# Altium footprint library PcbLib1.PcbLib: 1016 footprints (part 63 of 64)
Each footprint in its own frame and in the unit in brackets; x right, y up, seen from the top. Pads: shape width x height; smd on the part's side, far side on the other; paste and mask are expansions set on the pad; w line width, h text height; cw(c..) or ccw(c..) is an arc to the next point about the centre after c.
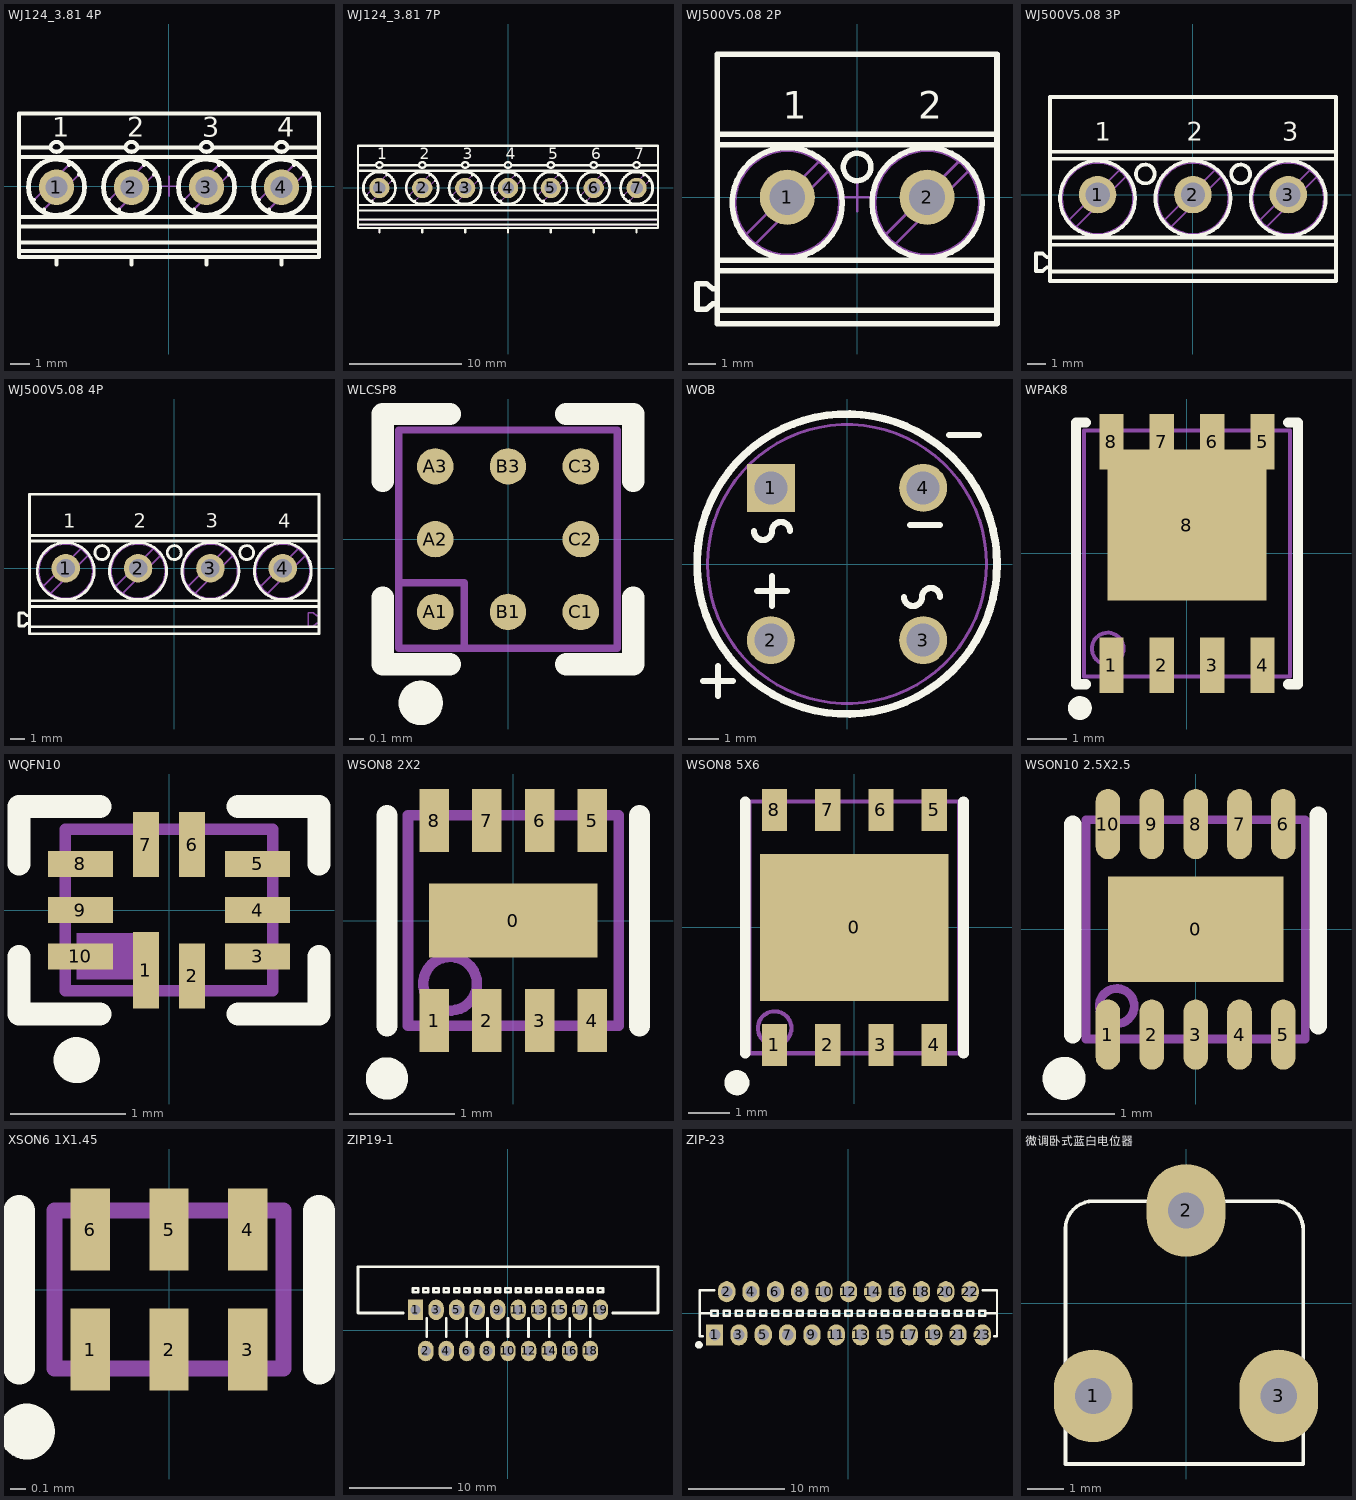
[diagram p62: the footprints below, top view; thin cyan lines are the x and y axes]

## WJ124_3.81 4P [mm] "PCB Terminal Block, Pitch 3.81mm, 4 Positions, Screw Connection"
height 8.5
pads (4):
  round 1.8 hole 1.1: 1(-5.715,-0.05) 2(-1.905,-0.05) 3(1.905,-0.05) 4(5.715,-0.05)
Top Overlay:
  circle w0.2: c1.905,-0.05 r1.45
  circle w0.2: c5.715,-0.05 r1.45
  circle w0.2: c-1.905,-0.05 r1.45
  circle w0.2: c-5.715,-0.05 r1.45
  circle w0.2: c5.715,-0.05 r1.4
  circle w0.2: c1.905,-0.05 r1.4
  circle w0.2: c-1.905,-0.05 r1.4
  circle w0.2: c-5.715,-0.05 r1.4
  lines w0.2: -7.62,-3.3 7.62,-3.3 ; -7.62,-2.861 7.62,-2.861 ; -7.62,-2.049 7.62,-2.049 ; -7.62,-1.566 7.62,-1.566 ; -7.62,1.487 7.62,1.487 ; -7.62,1.962 -6.017,1.962 ; -6.921,-0.761 -6.848,-0.688 ; -6.426,-1.256 -6.353,-1.183 ; -5.715,-3.981 -5.715,-3.6 ; -5.413,1.962 -2.207,1.962 ; -5.077,1.083 -5.004,1.156 ; -4.582,0.588 -4.509,0.661 ; -3.111,-0.761 -3.038,-0.688 ; -2.616,-1.256 -2.543,-1.183 ; -1.905,-3.981 -1.905,-3.6 ; -1.603,1.962 1.603,1.962 ; -1.267,1.083 -1.194,1.156 ; -0.772,0.588 -0.699,0.661 ; 0.699,-0.761 0.772,-0.688 ; 1.194,-1.256 1.267,-1.183 ; 1.905,-3.981 1.905,-3.6 ; 2.207,1.962 5.413,1.962 ; 2.543,1.083 2.616,1.156 ; 3.038,0.588 3.111,0.661 ; 4.509,-0.761 4.582,-0.688 ; 5.004,-1.256 5.077,-1.183 ; 5.715,-3.981 5.715,-3.6 ; 6.017,1.962 7.62,1.962 ; 6.353,1.083 6.426,1.156 ; 6.848,0.588 6.921,0.661 ; -7.62,-3.6 7.62,-3.6 7.62,3.7 -7.62,3.7 -7.62,-3.6 ; -6.016,1.923 cw(c-5.715,1.948) -5.414,1.923 cw(c-5.715,2.098) -6.016,1.923 ; -2.206,1.923 cw(c-1.905,1.948) -1.604,1.923 cw(c-1.905,2.098) -2.206,1.923 ; 1.604,1.923 cw(c1.905,1.948) 2.206,1.923 cw(c1.905,2.098) 1.604,1.923 ; 5.414,1.923 cw(c5.715,1.948) 6.016,1.923 cw(c5.715,2.098) 5.414,1.923
  text "1" at -5.925,2.525 h1
  text "2" at -2.115,2.525 h1
  text "3" at 1.695,2.525 h1
  text "4" at 5.505,2.525 h1
Mechanical 8:
  lines w0.1: -6.215,-0.05 -5.715,-0.05 ; -5.715,-0.55 -5.715,-0.05 ; -5.715,0.45 -5.715,-0.05 ; -5.215,-0.05 -5.715,-0.05 ; -2.405,-0.05 -1.905,-0.05 ; -1.905,-0.55 -1.905,-0.05 ; -1.905,0.45 -1.905,-0.05 ; -1.405,-0.05 -1.905,-0.05 ; -0.5,0 0,0 ; 0,-0.5 0,0 ; 0,0.5 0,0 ; 0.5,0 0,0 ; 1.405,-0.05 1.905,-0.05 ; 1.905,-0.55 1.905,-0.05 ; 1.905,0.45 1.905,-0.05 ; 2.405,-0.05 1.905,-0.05 ; 5.215,-0.05 5.715,-0.05 ; 5.715,-0.55 5.715,-0.05 ; 5.715,0.45 5.715,-0.05 ; 6.215,-0.05 5.715,-0.05
Mechanical 14:
  circle w0.1: c1.905,-0.05 r1.45
  circle w0.1: c5.715,-0.05 r1.45
  circle w0.1: c-1.905,-0.05 r1.45
  circle w0.1: c-5.715,-0.05 r1.45
  circle w0.1: c5.715,-0.05 r1.4
  circle w0.1: c1.905,-0.05 r1.4
  circle w0.1: c-1.905,-0.05 r1.4
  circle w0.1: c-5.715,-0.05 r1.4
  lines w0.1: -7.62,-3.3 7.62,-3.3 ; -7.62,-2.861 7.62,-2.861 ; -7.62,-2.049 7.62,-2.049 ; -7.62,-1.566 7.62,-1.566 ; -7.62,1.487 7.62,1.487 ; -7.62,1.962 -6.017,1.962 ; -6.921,-0.761 -5.004,1.156 ; -6.426,-1.256 -4.509,0.661 ; -5.715,-3.981 -5.715,-3.6 ; -5.413,1.962 -2.207,1.962 ; -3.111,-0.761 -1.194,1.156 ; -2.616,-1.256 -0.699,0.661 ; -1.905,-3.981 -1.905,-3.6 ; -1.603,1.962 1.603,1.962 ; 0.699,-0.761 2.616,1.156 ; 1.194,-1.256 3.111,0.661 ; 1.905,-3.981 1.905,-3.6 ; 2.207,1.962 5.413,1.962 ; 4.509,-0.761 6.426,1.156 ; 5.004,-1.256 6.921,0.661 ; 5.715,-3.981 5.715,-3.6 ; 6.017,1.962 7.62,1.962 ; -7.62,-3.6 7.62,-3.6 7.62,3.7 -7.62,3.7 -7.62,-3.6 ; -6.016,1.923 cw(c-5.715,1.948) -5.414,1.923 cw(c-5.715,2.098) -6.016,1.923 ; -2.206,1.923 cw(c-1.905,1.948) -1.604,1.923 cw(c-1.905,2.098) -2.206,1.923 ; 1.604,1.923 cw(c1.905,1.948) 2.206,1.923 cw(c1.905,2.098) 1.604,1.923 ; 5.414,1.923 cw(c5.715,1.948) 6.016,1.923 cw(c5.715,2.098) 5.414,1.923
  text "1" at -5.925,2.525 h1
  text "2" at -2.115,2.525 h1
  text "3" at 1.695,2.525 h1
  text "4" at 5.505,2.525 h1
3D body "PHOENIX_1727036.stp": height 8.5, standoff -3.5, extent -7.62,-3.6 7.62,3.7

## WJ124_3.81 7P [mm] "PCB Terminal Block, Pitch 3.81mm, 7 Positions, Screw Connection"
height 8.5
pads (7):
  round 1.8 hole 1.1: 1(-11.43,0) 2(-7.62,0) 3(-3.81,0) 4(0,0) 5(3.81,0) 6(7.62,0) 7(11.43,0)
Top Overlay:
  circle w0.2: c-11.43,0 r1.45
  circle w0.2: c-11.43,0 r1.4
  circle w0.2: c-7.62,0 r1.45
  circle w0.2: c-7.62,0 r1.4
  circle w0.2: c-3.81,0 r1.45
  circle w0.2: c-3.81,0 r1.4
  circle w0.2: c0,0 r1.45
  circle w0.2: c0,0 r1.4
  circle w0.2: c3.81,0 r1.45
  circle w0.2: c3.81,0 r1.4
  circle w0.2: c7.62,0 r1.45
  circle w0.2: c7.62,0 r1.4
  circle w0.2: c11.43,0 r1.45
  circle w0.2: c11.43,0 r1.4
  lines w0.2: -13.335,-3.25 13.335,-3.25 ; -13.335,-2.811 13.335,-2.811 ; -13.335,-1.999 13.335,-1.999 ; -13.335,-1.516 13.335,-1.516 ; -13.335,1.537 13.335,1.537 ; -13.335,2.012 -11.732,2.012 ; -12.636,-0.711 -12.563,-0.638 ; -12.141,-1.206 -12.068,-1.133 ; -11.43,-3.931 -11.43,-3.55 ; -11.128,2.012 -7.922,2.012 ; -10.792,1.133 -10.719,1.206 ; -10.297,0.638 -10.224,0.711 ; -8.826,-0.711 -8.753,-0.638 ; -8.331,-1.206 -8.258,-1.133 ; -7.62,-3.931 -7.62,-3.55 ; -7.318,2.012 -4.112,2.012 ; -6.982,1.133 -6.909,1.206 ; -6.487,0.638 -6.414,0.711 ; -5.016,-0.711 -4.943,-0.638 ; -4.521,-1.206 -4.448,-1.133 ; -3.81,-3.931 -3.81,-3.55 ; -3.508,2.012 -0.302,2.012 ; -3.172,1.133 -3.099,1.206 ; -2.677,0.638 -2.604,0.711 ; -1.206,-0.711 -1.133,-0.638 ; -0.711,-1.206 -0.638,-1.133 ; 0,-3.931 0,-3.55 ; 0.302,2.012 3.508,2.012 ; 0.638,1.133 0.711,1.206 ; 1.133,0.638 1.206,0.711 ; 2.604,-0.711 2.677,-0.638 ; 3.099,-1.206 3.172,-1.133 ; 3.81,-3.931 3.81,-3.55 ; 4.112,2.012 7.318,2.012 ; 4.448,1.133 4.521,1.206 ; 4.943,0.638 5.016,0.711 ; 6.414,-0.711 6.487,-0.638 ; 6.909,-1.206 6.982,-1.133 ; 7.62,-3.931 7.62,-3.55 ; 7.922,2.012 11.128,2.012 ; 8.258,1.133 8.331,1.206 ; 8.753,0.638 8.826,0.711 ; 10.224,-0.711 10.297,-0.638 ; 10.719,-1.206 10.792,-1.133 ; 11.43,-3.931 11.43,-3.55 ; 11.732,2.012 13.335,2.012 ; 12.068,1.133 12.141,1.206 ; 12.563,0.638 12.636,0.711 ; -13.335,-3.55 13.335,-3.55 13.335,3.75 -13.335,3.75 -13.335,-3.55 ; -11.731,1.973 cw(c-11.43,1.998) -11.129,1.973 cw(c-11.43,2.148) -11.731,1.973 ; -7.921,1.973 cw(c-7.62,1.998) -7.319,1.973 cw(c-7.62,2.148) -7.921,1.973 ; -4.111,1.973 cw(c-3.81,1.998) -3.509,1.973 cw(c-3.81,2.148) -4.111,1.973 ; -0.301,1.973 cw(c0,1.998) 0.301,1.973 cw(c0,2.148) -0.301,1.973 ; 3.509,1.973 cw(c3.81,1.998) 4.111,1.973 cw(c3.81,2.148) 3.509,1.973 ; 7.319,1.973 cw(c7.62,1.998) 7.921,1.973 cw(c7.62,2.148) 7.319,1.973 ; 11.129,1.973 cw(c11.43,1.998) 11.731,1.973 cw(c11.43,2.148) 11.129,1.973
  text "1" at -11.64,2.575 h1
  text "2" at -7.83,2.575 h1
  text "3" at -4.02,2.575 h1
  text "4" at -0.21,2.575 h1
  text "5" at 3.6,2.575 h1
  text "6" at 7.41,2.575 h1
  text "7" at 11.22,2.575 h1
Mechanical 8:
  lines w0.1: -11.93,0 -11.43,0 ; -11.43,-0.5 -11.43,0 ; -11.43,0.5 -11.43,0 ; -10.93,0 -11.43,0 ; -8.12,0 -7.62,0 ; -7.62,-0.5 -7.62,0 ; -7.62,0.5 -7.62,0 ; -7.12,0 -7.62,0 ; -4.31,0 -3.81,0 ; -3.81,-0.5 -3.81,0 ; -3.81,0.5 -3.81,0 ; -3.31,0 -3.81,0 ; 3.31,0 3.81,0 ; 3.81,-0.5 3.81,0 ; 3.81,0.5 3.81,0 ; 4.31,0 3.81,0 ; 7.12,0 7.62,0 ; 7.62,-0.5 7.62,0 ; 7.62,0.5 7.62,0 ; 8.12,0 7.62,0 ; 10.93,0 11.43,0 ; 11.43,-0.5 11.43,0 ; 11.43,0.5 11.43,0 ; 11.93,0 11.43,0 ; 0,0 0,0.5 0,0 ; 0,0 0.5,0 0,0 ; 0,0 0,-0.5 0,0 ; 0,0 -0.5,0 0,0
Mechanical 14:
  circle w0.1: c-11.43,0 r1.45
  circle w0.1: c-11.43,0 r1.4
  circle w0.1: c-7.62,0 r1.45
  circle w0.1: c-7.62,0 r1.4
  circle w0.1: c-3.81,0 r1.45
  circle w0.1: c-3.81,0 r1.4
  circle w0.1: c0,0 r1.45
  circle w0.1: c0,0 r1.4
  circle w0.1: c3.81,0 r1.45
  circle w0.1: c3.81,0 r1.4
  circle w0.1: c7.62,0 r1.45
  circle w0.1: c7.62,0 r1.4
  circle w0.1: c11.43,0 r1.45
  circle w0.1: c11.43,0 r1.4
  lines w0.1: -13.335,-3.25 13.335,-3.25 ; -13.335,-2.811 13.335,-2.811 ; -13.335,-1.999 13.335,-1.999 ; -13.335,-1.516 13.335,-1.516 ; -13.335,1.537 13.335,1.537 ; -13.335,2.012 -11.732,2.012 ; -12.636,-0.711 -10.719,1.206 ; -12.141,-1.206 -10.224,0.711 ; -11.43,-3.931 -11.43,-3.55 ; -11.128,2.012 -7.922,2.012 ; -8.826,-0.711 -6.909,1.206 ; -8.331,-1.206 -6.414,0.711 ; -7.62,-3.931 -7.62,-3.55 ; -7.318,2.012 -4.112,2.012 ; -5.016,-0.711 -3.099,1.206 ; -4.521,-1.206 -2.604,0.711 ; -3.81,-3.931 -3.81,-3.55 ; -3.508,2.012 -0.302,2.012 ; -1.206,-0.711 0.711,1.206 ; -0.711,-1.206 1.206,0.711 ; 0,-3.931 0,-3.55 ; 0.302,2.012 3.508,2.012 ; 2.604,-0.711 4.521,1.206 ; 3.099,-1.206 5.016,0.711 ; 3.81,-3.931 3.81,-3.55 ; 4.112,2.012 7.318,2.012 ; 6.414,-0.711 8.331,1.206 ; 6.909,-1.206 8.826,0.711 ; 7.62,-3.931 7.62,-3.55 ; 7.922,2.012 11.128,2.012 ; 10.224,-0.711 12.141,1.206 ; 10.719,-1.206 12.636,0.711 ; 11.43,-3.931 11.43,-3.55 ; 11.732,2.012 13.335,2.012 ; -13.335,-3.55 13.335,-3.55 13.335,3.75 -13.335,3.75 -13.335,-3.55 ; -11.731,1.973 cw(c-11.43,1.998) -11.129,1.973 cw(c-11.43,2.148) -11.731,1.973 ; -7.921,1.973 cw(c-7.62,1.998) -7.319,1.973 cw(c-7.62,2.148) -7.921,1.973 ; -4.111,1.973 cw(c-3.81,1.998) -3.509,1.973 cw(c-3.81,2.148) -4.111,1.973 ; -0.301,1.973 cw(c0,1.998) 0.301,1.973 cw(c0,2.148) -0.301,1.973 ; 3.509,1.973 cw(c3.81,1.998) 4.111,1.973 cw(c3.81,2.148) 3.509,1.973 ; 7.319,1.973 cw(c7.62,1.998) 7.921,1.973 cw(c7.62,2.148) 7.319,1.973 ; 11.129,1.973 cw(c11.43,1.998) 11.731,1.973 cw(c11.43,2.148) 11.129,1.973
  text "1" at -11.64,2.575 h1
  text "2" at -7.83,2.575 h1
  text "3" at -4.02,2.575 h1
  text "4" at -0.21,2.575 h1
  text "5" at 3.6,2.575 h1
  text "6" at 7.41,2.575 h1
  text "7" at 11.22,2.575 h1
3D body "PHOENIX_1727065.stp": height 8.5, standoff -3.5, extent -13.335,-3.6 13.335,3.7

## WJ500V5.08 2P [mm] "Terminal Block, 17.5A 400V, Pitch 5.08mm, 2 Positions, Screw Connection"
height 13.8
pads (2):
  round 2 hole 1.3: 1(-2.54,0) 2(2.54,0)
Top Overlay:
  circle w0.2: c2.54,-0.2 r2
  circle w0.2: c-2.54,-0.2 r2
  circle w0.2: c0,1.1 r0.5
  lines w0.2: -5.08,-4.1 5.08,-4.1 ; -5.08,-3.869 -5.247,-3.869 -5.479,-4.064 -5.821,-4.064 -5.821,-3.136 -5.479,-3.136 -5.247,-3.331 -5.08,-3.331 ; -5.08,-2.672 5.08,-2.672 ; -5.08,-2.283 5.08,-2.283 ; -5.08,1.909 5.08,1.909 ; -5.08,2.29 5.08,2.29 ; -5.08,-4.6 -5.08,5.2 5.08,5.2 5.08,-4.6 -5.08,-4.6
  text "1" at -2.699,2.857 h1
  text "2" at 2.222,2.857 h1
Mechanical 8:
  lines w0.1: -3.04,0 -2.54,0 ; -2.54,-0.5 -2.54,0 ; -2.54,0.5 -2.54,0 ; -2.04,0 -2.54,0 ; -0.5,0 0,0 ; 0,-0.5 0,0 ; 0,0.5 0,0 ; 0.5,0 0,0 ; 2.04,0 2.54,0 ; 2.54,-0.5 2.54,0 ; 2.54,0.5 2.54,0 ; 3.04,0 2.54,0
Mechanical 14:
  circle w0.1: c-2.54,-0.2 r1.891
  circle w0.1: c2.54,-0.2 r1.891
  circle w0.1: c0,1.1 r0.5
  circle w0.1: c-2.54,-0.2 r2
  circle w0.1: c2.54,-0.2 r2
  lines w0.1: -5.08,-4.1 5.08,-4.1 ; -5.08,-3.869 -5.247,-3.869 -5.479,-4.064 -5.821,-4.064 -5.821,-3.136 -5.479,-3.136 -5.247,-3.331 -5.08,-3.331 ; -5.08,-2.672 5.08,-2.672 ; -5.08,-2.283 5.08,-2.283 ; -5.08,1.909 5.08,1.909 ; -5.08,2.29 5.08,2.29 ; -4.043,-1.349 -1.391,1.303 ; -3.689,-1.703 -1.037,0.949 ; 1.037,-1.349 3.689,1.303 ; 1.391,-1.703 4.043,0.949 ; -5.08,-4.6 5.08,-4.6 5.08,5.2 -5.08,5.2 -5.08,-4.6
  text "1" at -2.699,2.857 h1
  text "2" at 2.222,2.857 h1
3D body "PHOENIX_1715721.stp": height 14.19, standoff -3.5, extent -5.821,-4.6 5.08,5.2

## WJ500V5.08 3P [mm] "Terminal Block, 17.5A 400V, Pitch 5.08mm, 3 Positions, Screw Connection"
height 13.8
pads (3):
  round 2 hole 1.3: 1(-5.08,0) 2(0,0) 3(5.08,0)
Top Overlay:
  circle w0.2: c5.08,-0.2 r2
  circle w0.2: c0,-0.2 r2
  circle w0.2: c-5.08,-0.2 r2
  circle w0.2: c2.54,1.1 r0.5
  circle w0.2: c-2.54,1.1 r0.5
  lines w0.2: -7.62,-4.1 7.62,-4.1 ; -7.62,-3.869 -7.787,-3.869 -8.019,-4.064 -8.361,-4.064 -8.361,-3.136 -8.019,-3.136 -7.787,-3.331 -7.62,-3.331 ; -7.62,-2.672 7.62,-2.672 ; -7.62,-2.283 7.62,-2.283 ; -7.62,1.909 7.62,1.909 ; -7.62,2.29 7.62,2.29 ; -7.62,-4.6 -7.62,5.2 7.62,5.2 7.62,-4.6 -7.62,-4.6
  text "3" at 4.763,2.857 h1
  text "2" at -0.318,2.857 h1
  text "1" at -5.239,2.857 h1
Mechanical 8:
  lines w0.1: -5.58,0 -5.08,0 ; -5.08,-0.5 -5.08,0 ; -5.08,0.5 -5.08,0 ; -4.58,0 -5.08,0 ; -0.5,0 0,0 ; 0,-0.5 0,0 ; 0,0.5 0,0 ; 0.5,0 0,0 ; 4.58,0 5.08,0 ; 5.08,-0.5 5.08,0 ; 5.08,0.5 5.08,0 ; 5.58,0 5.08,0
Mechanical 14:
  circle w0.1: c-5.08,-0.2 r1.891
  circle w0.1: c0,-0.2 r1.891
  circle w0.1: c5.08,-0.2 r1.891
  circle w0.1: c-2.54,1.1 r0.5
  circle w0.1: c2.54,1.1 r0.5
  circle w0.1: c-5.08,-0.2 r2
  circle w0.1: c0,-0.2 r2
  circle w0.1: c5.08,-0.2 r2
  lines w0.1: -7.62,-4.1 7.62,-4.1 ; -7.62,-3.869 -7.787,-3.869 -8.019,-4.064 -8.361,-4.064 -8.361,-3.136 -8.019,-3.136 -7.787,-3.331 -7.62,-3.331 ; -7.62,-2.672 7.62,-2.672 ; -7.62,-2.283 7.62,-2.283 ; -7.62,1.909 7.62,1.909 ; -7.62,2.29 7.62,2.29 ; -6.583,-1.349 -3.931,1.303 ; -6.229,-1.703 -3.577,0.949 ; -1.503,-1.349 1.149,1.303 ; -1.149,-1.703 1.503,0.949 ; 3.577,-1.349 6.229,1.303 ; 3.931,-1.703 6.583,0.949 ; -7.62,-4.6 7.62,-4.6 7.62,5.2 -7.62,5.2 -7.62,-4.6
  text "3" at 4.763,2.857 h1
  text "2" at -0.318,2.857 h1
  text "1" at -5.239,2.857 h1
3D body "PHOENIX_1715734.stp": height 14.19, standoff -3.5, extent -8.361,-4.6 7.62,5.2

## WJ500V5.08 4P [mm] "Terminal Block, 17.5A 400V, Pitch 5.08mm, 4 Positions, Screw Connection"
height 13.8
pads (4):
  round 2 hole 1.3: 1(-7.62,0) 2(-2.54,0) 3(2.54,0) 4(7.62,0)
Top Overlay:
  circle w0.2: c-7.62,-0.2 r2
  circle w0.2: c-2.54,-0.2 r2
  circle w0.2: c2.54,-0.2 r2
  circle w0.2: c7.62,-0.2 r2
  circle w0.2: c-5.08,1.1 r0.49
  circle w0.2: c0,1.1 r0.49
  circle w0.2: c5.08,1.1 r0.49
  lines w0.2: -10.16,-4.1 10.16,-4.1 ; -10.16,-3.869 -10.327,-3.869 -10.559,-4.064 -10.901,-4.064 -10.901,-3.136 -10.559,-3.136 -10.327,-3.331 -10.16,-3.331 ; -10.16,-2.672 10.16,-2.672 ; -10.16,-2.283 10.16,-2.283 ; -10.16,1.909 10.16,1.909 ; -10.16,2.29 10.16,2.29 ; -10.16,-4.6 -10.16,5.2 10.16,5.2 10.16,-4.6 -10.16,-4.6
  text "4" at 7.302,2.857 h1
  text "3" at 2.222,2.857 h1
  text "2" at -2.857,2.857 h1
  text "1" at -7.779,2.857 h1
Mechanical 8:
  lines w0.1: -8.12,0 -7.62,0 ; -7.62,-0.5 -7.62,0 ; -7.62,0.5 -7.62,0 ; -7.12,0 -7.62,0 ; -3.04,0 -2.54,0 ; -2.54,-0.5 -2.54,0 ; -2.54,0.5 -2.54,0 ; -2.04,0 -2.54,0 ; 2.04,0 2.54,0 ; 2.54,-0.5 2.54,0 ; 2.54,0.5 2.54,0 ; 3.04,0 2.54,0 ; 7.12,0 7.62,0 ; 7.62,-0.5 7.62,0 ; 7.62,0.5 7.62,0 ; 8.12,0 7.62,0 ; 10.16,-3.869 9.993,-3.869 9.761,-4.064 9.419,-4.064 9.419,-3.136 9.761,-3.136 9.993,-3.331 10.16,-3.331
Mechanical 14:
  circle w0.1: c5.08,1.1 r0.49
  circle w0.1: c0,1.1 r0.49
  circle w0.1: c-5.08,1.1 r0.49
  circle w0.1: c7.62,-0.2 r2
  circle w0.1: c7.62,-0.2 r1.891
  circle w0.1: c2.54,-0.2 r2
  circle w0.1: c2.54,-0.2 r1.891
  circle w0.1: c-2.54,-0.2 r2
  circle w0.1: c-2.54,-0.2 r1.891
  circle w0.1: c-7.62,-0.2 r2
  circle w0.1: c-7.62,-0.2 r1.891
  lines w0.1: -10.16,-4.1 10.16,-4.1 ; -10.16,-3.869 -10.327,-3.869 -10.559,-4.064 -10.901,-4.064 -10.901,-3.136 -10.559,-3.136 -10.327,-3.331 -10.16,-3.331 ; -10.16,-2.672 10.16,-2.672 ; -10.16,-2.283 10.16,-2.283 ; -10.16,1.909 10.16,1.909 ; -10.16,2.29 10.16,2.29 ; -9.182,-1.267 -6.553,1.362 ; -8.687,-1.762 -6.058,0.867 ; -4.102,-1.267 -1.473,1.362 ; -3.607,-1.762 -0.978,0.867 ; 0.978,-1.267 3.607,1.362 ; 1.473,-1.762 4.102,0.867 ; 6.058,-1.267 8.687,1.362 ; 6.553,-1.762 9.182,0.867 ; -10.16,-4.6 10.16,-4.6 10.16,5.2 -10.16,5.2 -10.16,-4.6
  text "4" at 7.302,2.857 h1
  text "3" at 2.222,2.857 h1
  text "2" at -2.857,2.857 h1
  text "1" at -7.779,2.857 h1
3D body "PHOENIX_1715747.stp": height 14.2, standoff -3.5, extent -10.901,-4.6 10.16,5.2

## WLCSP8 [mm]
pads (8):
  round 0.25 smd mask+0.051: A1(-0.5,-0.5) A2(-0.5,0) A3(-0.5,0.5) B1(0,-0.5) B3(0,0.5) C1(0.5,-0.5) C2(0.5,0) C3(0.5,0.5)
Top Overlay:
  circle w0.152: c-0.6,-1.125 r0.076
  lines w0.152: -0.86,-0.4 -0.86,-0.86 -0.4,-0.86 ; -0.86,0.4 -0.86,0.86 -0.4,0.86 ; 0.4,-0.86 0.86,-0.86 0.86,-0.4 ; 0.4,0.86 0.86,0.86 0.86,0.4
Mechanical 13:
  lines w0.05: -0.75,-0.3 -0.3,-0.3 -0.3,-0.75 ; -0.75,-0.75 -0.75,0.75 0.75,0.75 0.75,-0.75 -0.75,-0.75

## WOB [mm]
pads (4):
  rect 1.6x1.6 hole 1.1: 1(-2.54,2.54)
  round 1.6 hole 1.1: 2(-2.54,-2.54) 3(2.54,-2.54) 4(2.54,2.54)
Top Overlay:
  circle w0.254: c0,0 r5
  lines w0.203: -4.8,-3.9 -3.8,-3.9 ; -4.3,-4.4 -4.3,-3.4 ; -3.1,1.1 ccw(c-2.8,1.1) -2.5,1.1 cw(c-2.2,1.1) -1.9,1.1 ; -3,-0.9 -2,-0.9 ; -2.5,-1.4 -2.5,-0.4 ; 1.9,-1.1 ccw(c2.2,-1.1) 2.5,-1.1 cw(c2.8,-1.1) 3.1,-1.1 ; 2.1,1.3 3.1,1.3 ; 3.4,4.3 4.4,4.3
Mechanical 13:
  circle w0.1: c0,0 r4.65

## WPAK8 [mm]
pads (9):
  rect 0.61x1.4 smd: 1(-1.905,-2.816) 2(-0.635,-2.816) 3(0.635,-2.816) 4(1.905,-2.816) 5(1.905,2.816) 6(0.635,2.816) 7(-0.635,2.816) 8(-1.905,2.816)
  rect 4x3.81 smd: 8(0,0.716)
Top Overlay:
  circle w0.3: c-2.7,-3.9 r0.15
  lines w0.254: -2.55,-3.3 -2.8,-3.3 -2.8,3.3 -2.55,3.3 ; 2.55,-3.3 2.8,-3.3 2.8,3.3 2.55,3.3
Mechanical 13:
  circle w0.1: c-2,-2.4 r0.4
  lines w0.1: -2.6,-3.1 2.6,-3.1 2.6,3.1 -2.6,3.1 -2.6,-3.1

## WQFN10 [mm]
pads (10):
  rect 0.225x0.663 smd mask+0.051: 1(-0.2,-0.519)
  rect 0.225x0.563 smd mask+0.051: 2(0.2,-0.569) 6(0.2,0.569) 7(-0.2,0.569)
  rect 0.563x0.225 smd mask+0.051: 3(0.768,-0.4) 4(0.768,0) 5(0.768,0.4) 8(-0.768,0.4) 9(-0.768,0) 10(-0.768,-0.4)
Top Overlay:
  circle w0.2: c-0.8,-1.3 r0.1
  lines w0.2: -1.3,-0.4 -1.3,-0.9 -0.6,-0.9 ; -1.3,0.4 -1.3,0.9 -0.6,0.9 ; 0.6,-0.9 1.3,-0.9 1.3,-0.4 ; 0.6,0.9 1.3,0.9 1.3,0.4
Mechanical 13:
  region: -0.3,-0.6 -0.3,-0.2 -0.8,-0.2 -0.8,-0.6
  lines w0.1: -0.9,-0.7 -0.9,0.7 0.9,0.7 0.9,-0.7 -0.9,-0.7

## WSON8 2X2 [mm]
pads (9):
  rect 1.6x0.7 smd mask+0.051: 0(0,0)
  rect 0.28x0.6 smd mask+0.051: 1(-0.75,-0.95) 2(-0.25,-0.95) 3(0.25,-0.95) 4(0.75,-0.95) 5(0.75,0.95) 6(0.25,0.95) 7(-0.25,0.95) 8(-0.75,0.95)
Top Overlay:
  circle w0.203: c-1.2,-1.5 r0.1
  lines w0.2: -1.2,-1 -1.2,1 ; 1.2,-1 1.2,1
Mechanical 13:
  circle w0.1: c-0.6,-0.6 r0.255
  lines w0.1: -1,-1 -1,1 1,1 1,-1 -1,-1

## WSON8 5X6 [mm]
pads (9):
  rect 4.5x3.5 smd: 0(0,0)
  rect 0.6x1 smd: 1(-1.905,-2.8) 2(-0.635,-2.8) 3(0.635,-2.8) 4(1.905,-2.8) 5(1.905,2.8) 6(0.635,2.8) 7(-0.635,2.8) 8(-1.905,2.8)
Top Overlay:
  circle w0.3: c-2.8,-3.7 r0.15
  lines w0.254: -2.6,-3 -2.6,3 ; 2.6,-3 2.6,3
Mechanical 13:
  circle w0.1: c-1.9,-2.4 r0.4
  lines w0.1: -2.5,-3 2.5,-3 2.5,3 -2.5,3 -2.5,-3

## WSON10 2.5X2.5 [mm]
pads (11):
  rect 2x1.2 smd mask+0.051: 0(0,0)
  oval 0.28x0.8 smd paste-0.025 mask+0.051: 1(-1,-1.2) 2(-0.5,-1.2) 3(0,-1.2) 4(0.5,-1.2) 5(1,-1.2) 6(1,1.2) 7(0.5,1.2) 8(0,1.2) 9(-0.5,1.2) 10(-1,1.2)
Top Overlay:
  circle w0.25: c-1.5,-1.7 r0.12
  lines w0.2: -1.4,-1.2 -1.4,1.2 ; 1.4,-1.1 1.4,1.3
Mechanical 13:
  circle w0.1: c-0.9,-0.875 r0.2
  lines w0.1: -1.25,-1.25 -1.25,1.25 1.25,1.25 1.25,-1.25 -1.25,-1.25

## XSON6 1X1.45 [mm]
pads (6):
  rect 0.25x0.52 smd mask+0.051: 1(-0.5,-0.38) 2(0,-0.38) 3(0.5,-0.38) 4(0.5,0.38) 5(0,0.38) 6(-0.5,0.38)
Top Overlay:
  circle w0.254: c-0.9,-0.9 r0.05
  lines w0.2: -0.95,-0.5 -0.95,0.5 ; 0.95,-0.5 0.95,0.5
Mechanical 13:
  lines w0.1: -0.725,-0.5 -0.725,0.5 0.725,0.5 0.725,-0.5 -0.725,-0.5

## ZIP19-1 [mm]
pads (19):
  rect 1.5x2 hole 1: 1(-9,2)
  oval 1.5x2 hole 1: 2(-8,-2) 3(-7,2) 4(-6,-2) 5(-5,2) 6(-4,-2) 7(-3,2) 8(-2,-2) 9(-1,2) 10(0,-2) 11(1,2) 12(2,-2) 13(3,2) 14(4,-2) 15(5,2) 16(6,-2) 17(7,2) 18(8,-2) 19(9,2)
Top Overlay:
  lines w0.254: -10.2,1.7 -14.6,1.7 -14.6,6.2 14.6,6.2 14.6,1.7 10.2,1.7 ; -7.9,-0.6 -7.9,1.2 ; -6,-0.6 -6,1.2 ; -4,-0.6 -4,1.2 ; -2,-0.6 -2,1.2 ; 0,-0.6 0,1.2 ; 2,-0.6 2,1.2 ; 4,-0.6 4,1.2 ; 6,-0.6 6,1.2 ; 8,-0.6 8,1.2 ; -9.25,3.7 -9.25,4.1 -8.75,4.1 -8.75,3.7 -9.25,3.7 ; -8.25,3.7 -7.75,3.7 -7.75,4.1 -8.25,4.1 -8.25,3.7 ; -7.25,3.7 -7.25,4.1 -6.75,4.1 -6.75,3.7 -7.25,3.7 ; -6.25,3.7 -5.75,3.7 -5.75,4.1 -6.25,4.1 -6.25,3.7 ; -5.25,3.7 -5.25,4.1 -4.75,4.1 -4.75,3.7 -5.25,3.7 ; -4.25,3.7 -3.75,3.7 -3.75,4.1 -4.25,4.1 -4.25,3.7 ; -3.25,3.7 -3.25,4.1 -2.75,4.1 -2.75,3.7 -3.25,3.7 ; -2.25,3.7 -1.75,3.7 -1.75,4.1 -2.25,4.1 -2.25,3.7 ; -1.25,3.7 -0.75,3.7 -0.75,4.1 -1.25,4.1 -1.25,3.7 ; -0.25,3.7 -0.25,4.1 0.25,4.1 0.25,3.7 -0.25,3.7 ; 0.75,3.7 0.75,4.1 1.25,4.1 1.25,3.7 0.75,3.7 ; 1.75,3.7 2.25,3.7 2.25,4.1 1.75,4.1 1.75,3.7 ; 2.75,3.7 2.75,4.1 3.25,4.1 3.25,3.7 2.75,3.7 ; 3.75,3.7 4.25,3.7 4.25,4.1 3.75,4.1 3.75,3.7 ; 4.75,3.7 4.75,4.1 5.25,4.1 5.25,3.7 4.75,3.7 ; 5.75,3.7 6.25,3.7 6.25,4.1 5.75,4.1 5.75,3.7 ; 6.75,3.7 6.75,4.1 7.25,4.1 7.25,3.7 6.75,3.7 ; 7.75,3.7 8.25,3.7 8.25,4.1 7.75,4.1 7.75,3.7 ; 8.75,3.7 8.75,4.1 9.25,4.1 9.25,3.7 8.75,3.7

## ZIP-23 [mm]
pads (23):
  rect 1.8x2.2 hole 1.2: 1(-13.97,-2.25)
  oval 1.8x2.2 hole 1.2: 2(-12.7,2.25) 3(-11.43,-2.25) 4(-10.16,2.25) 5(-8.89,-2.25) 6(-7.62,2.25) 7(-6.35,-2.25) 8(-5.08,2.25) 9(-3.81,-2.25) 10(-2.54,2.25) 11(-1.27,-2.25) 12(0,2.25) 13(1.27,-2.25) 14(2.54,2.25) 15(3.81,-2.25) 16(5.08,2.25) 17(6.35,-2.25) 18(7.62,2.25) 19(8.89,-2.25) 20(10.16,2.25) 21(11.43,-2.25) 22(12.7,2.25) 23(13.97,-2.25)
Top Overlay:
  circle w0.4: c-15.6,-3.3 r0.2
  lines w0.254: -15.5,0 -14.5,0 ; -15.2,-2.4 -15.5,-2.4 -15.5,2.4 -14,2.4 ; 14,2.4 15.5,2.4 15.5,-2.4 15.2,-2.4 ; 14.5,0 15.5,0 ; -14.295,-0.275 -14.295,0.275 -13.645,0.275 -13.645,-0.275 -14.295,-0.275 ; -13.025,-0.275 -12.375,-0.275 -12.375,0.275 -13.025,0.275 -13.025,-0.275 ; -11.755,-0.275 -11.755,0.275 -11.105,0.275 -11.105,-0.275 -11.755,-0.275 ; -10.485,-0.275 -9.835,-0.275 -9.835,0.275 -10.485,0.275 -10.485,-0.275 ; -9.215,-0.275 -9.215,0.275 -8.565,0.275 -8.565,-0.275 -9.215,-0.275 ; -7.945,-0.275 -7.295,-0.275 -7.295,0.275 -7.945,0.275 -7.945,-0.275 ; -6.675,-0.275 -6.675,0.275 -6.025,0.275 -6.025,-0.275 -6.675,-0.275 ; -5.405,-0.275 -4.755,-0.275 -4.755,0.275 -5.405,0.275 -5.405,-0.275 ; -4.135,-0.275 -4.135,0.275 -3.485,0.275 -3.485,-0.275 -4.135,-0.275 ; -2.865,-0.275 -2.215,-0.275 -2.215,0.275 -2.865,0.275 -2.865,-0.275 ; -1.595,-0.275 -0.945,-0.275 -0.945,0.275 -1.595,0.275 -1.595,-0.275 ; -0.325,-0.275 -0.325,0.275 0.325,0.275 0.325,-0.275 -0.325,-0.275 ; 0.945,-0.275 0.945,0.275 1.595,0.275 1.595,-0.275 0.945,-0.275 ; 2.215,-0.275 2.215,0.275 2.865,0.275 2.865,-0.275 2.215,-0.275 ; 3.485,-0.275 4.135,-0.275 4.135,0.275 3.485,0.275 3.485,-0.275 ; 4.755,-0.275 4.755,0.275 5.405,0.275 5.405,-0.275 4.755,-0.275 ; 6.025,-0.275 6.675,-0.275 6.675,0.275 6.025,0.275 6.025,-0.275 ; 7.295,-0.275 7.295,0.275 7.945,0.275 7.945,-0.275 7.295,-0.275 ; 8.565,-0.275 9.215,-0.275 9.215,0.275 8.565,0.275 8.565,-0.275 ; 9.835,-0.275 9.835,0.275 10.485,0.275 10.485,-0.275 9.835,-0.275 ; 11.105,-0.275 11.755,-0.275 11.755,0.275 11.105,0.275 11.105,-0.275 ; 12.375,-0.275 12.375,0.275 13.025,0.275 13.025,-0.275 12.375,-0.275 ; 13.645,-0.275 13.645,0.275 14.295,0.275 14.295,-0.275 13.645,-0.275

## 微调卧式蓝白电位器 [mil]
pads (3):
  oval 85x100 hole 39: 1(-100,-100) 2(0,100) 3(100,-100)
Top Overlay:
  lines w3.94: -130,-173.46 -130,80 cw(c-100,80) -100,110 95,110 cw(c95,78.46) 126.54,78.46 126.54,-173.46 -130,-173.46
3D body "User Library-Trimmer, 3306F-1.STEP": height 300, standoff -119.49, extent -134.05,-191.98 134.06,132.89